# Altium footprint library Miscellaneous Base.PcbLib: 153 footprints (part 5 of 10)
Each footprint in its own frame and in the unit in brackets; x right, y up, seen from the top. Pads: shape width x height; smd on the part's side, far side on the other; paste and mask are expansions set on the pad; w line width, h text height; cw(c..) or ccw(c..) is an arc to the next point about the centre after c.
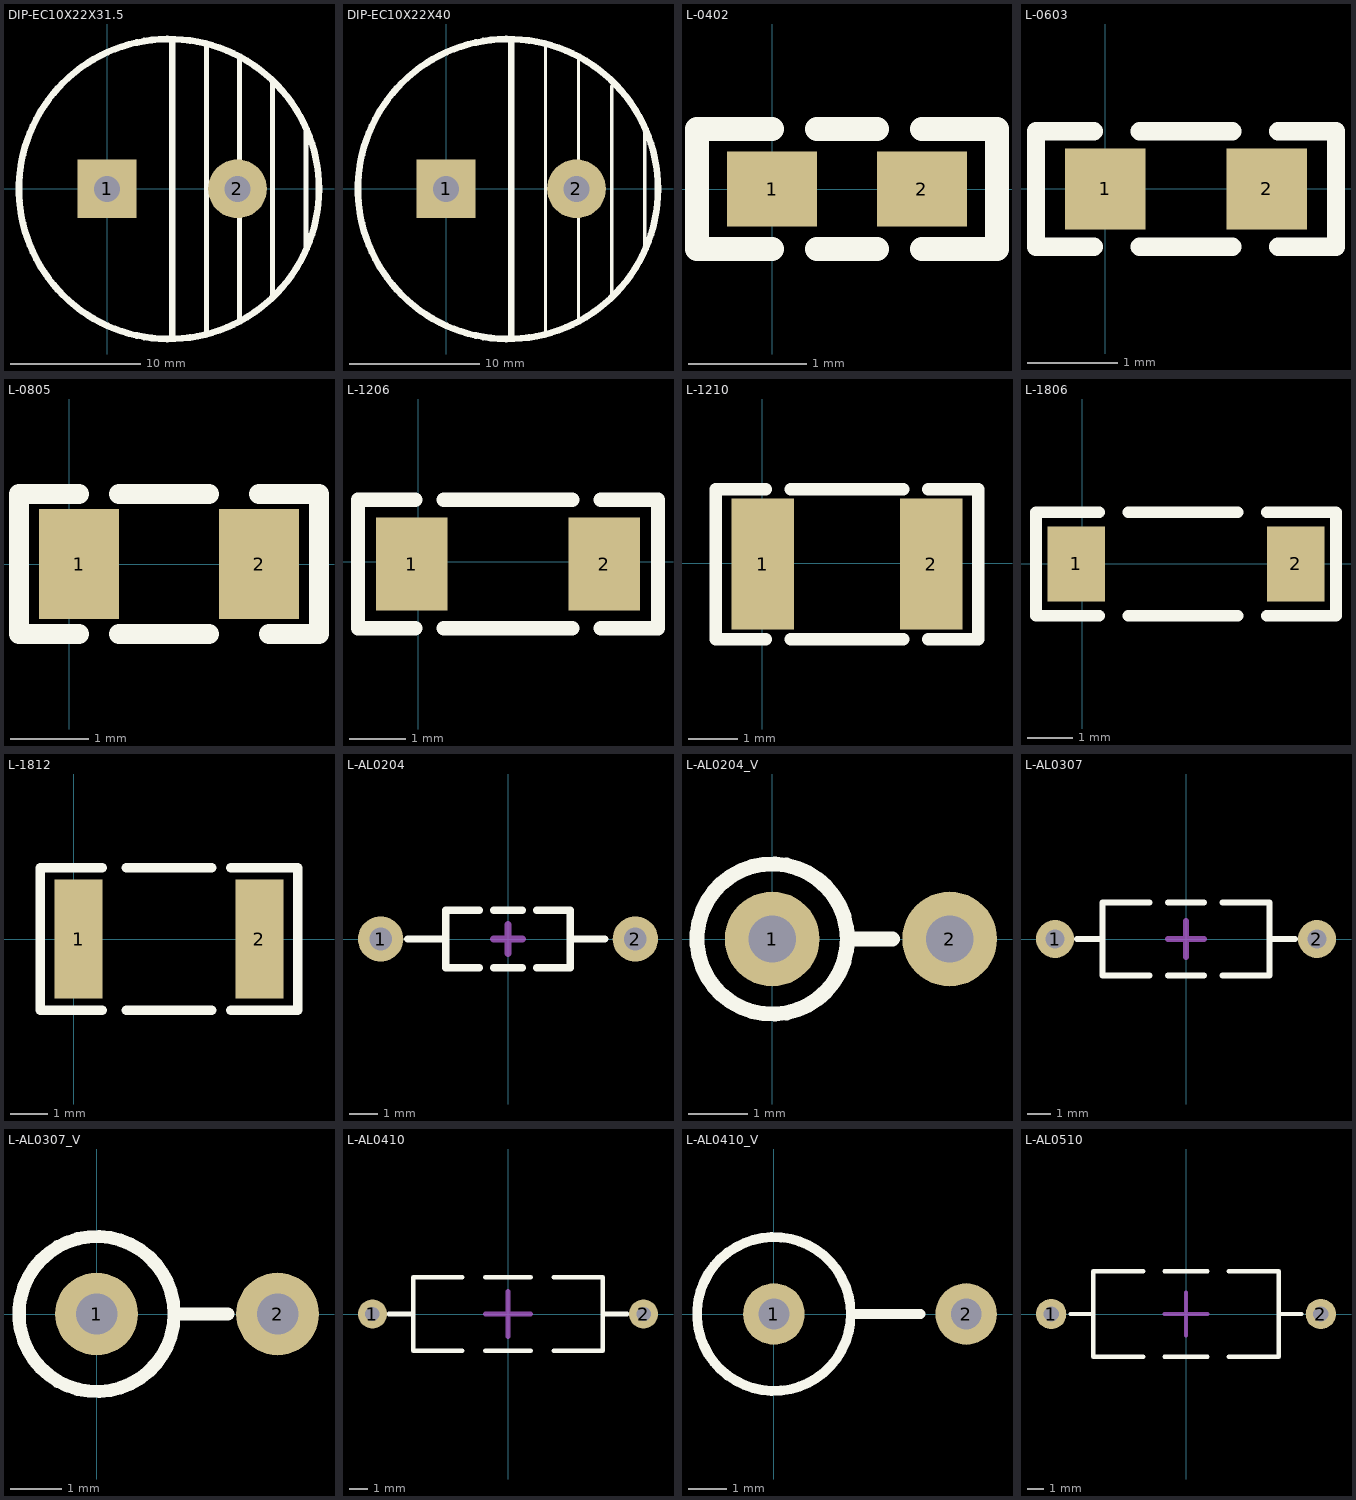
[diagram p4: the footprints below, top view; thin cyan lines are the x and y axes]

## DIP-EC10X22X31.5 [mm]
pads (2):
  rect 4.5x4.5 hole 2: 1(0,0)
  round 4.5 hole 2: 2(10,0)
Top Overlay:
  circle w0.508: c4.752,-0.013 r11.5
  lines w0.381: 7.62,-10.922 7.62,10.922 ; 10.16,-10.16 10.16,10.16 ; 12.7,-8.128 12.7,8.128 ; 15.24,-4.572 15.24,4.572
  lines w0.508: 5,-11.25 5,11.25
3D body "CAP 10X22X31.5.STEP": height 31.53, standoff -3.38, extent -5.969,-10.996 16.041,10.996

## DIP-EC10X22X40 [mm]
pads (2):
  rect 4.5x4.5 hole 2: 1(0,0)
  round 4.5 hole 2: 2(10,0)
Top Overlay:
  circle w0.508: c4.752,-0.013 r11.5
  lines w0.254: 7.62,-11.176 7.62,10.922 ; 10.16,-9.906 10.16,10.16 ; 12.7,-8.382 12.7,7.874 ; 15.24,-4.572 15.24,4.318
  lines w0.508: 5,-11.25 5,11.25
3D body "CAP 10X22X40.STEP": height 40.03, standoff -3.38, extent -6.005,-10.949 16.005,11.049

## L-0402 [mil] "小功率贴片电感"
pads (2):
  rect 30x25 smd: 1(0,0) 2(50,0)
Top Overlay:
  lines w8: 0,-20 -25,-20 -25,20 -15,20 0,20 ; 15,-20 35,-20 ; 15,20 35,20 ; 50,-20 75,-20 75,20 50,20
3D body "0402L.STEP": height 19.68, standoff 0, extent 5.31,-9.68 44.69,10

## L-0603 [mil] "小功率贴片电感"
pads (2):
  rect 35x35 smd: 1(0,0) 2(70,0)
Top Overlay:
  lines w8: -5,-25 -30,-25 -30,25 -5,25 ; 15,-25 55,-25 ; 15,25 55,25 ; 75,-25 100,-25 100,25 75,25
3D body "0603L.STEP": height 31.5, standoff 0, extent 3.5,-16.5 66.5,15

## L-0805 [mil] "小功率贴片电感"
pads (2):
  rect 40x55 smd: 1(5,0) 2(95,0)
Top Overlay:
  lines w10: 5,-35 -25,-35 -25,35 5,35 ; 25,-35 70,-35 ; 25,35 70,35 ; 95,35 125,35 125,-35 100,-35
3D body "0805L.STEP": height 35.43, standoff 0, extent 15,-23.62 93.74,23.62

## L-1206 [mil] "小功率贴片电感"
pads (2):
  rect 50x65 smd: 1(-4.51,-1.5) 2(130.49,-1.5)
Top Overlay:
  lines w10: -2.01,-46.5 -42.01,-46.5 -42.01,43.5 -2.01,43.5 ; 17.99,-46.5 107.99,-46.5 ; 17.99,43.5 107.99,43.5 ; 127.99,-46.5 167.99,-46.5 167.99,43.5 127.99,43.5
3D body "1206L.STEP": height 35.43, standoff 0, extent 0,-31.5 125.98,31.5

## L-1210 [mm] "小功率贴片电感"
pads (2):
  rect 1.27x2.667 smd: 1(0.012,-0.02) 2(3.441,-0.02)
Top Overlay:
  lines w0.254: 0.076,-1.544 -0.94,-1.544 -0.94,1.504 0.076,1.504 ; 0.584,-1.544 2.87,-1.544 ; 0.584,1.504 2.87,1.504 ; 3.378,-1.544 4.394,-1.544 4.394,1.504 3.378,1.504
3D body "1210L.STEP": height 1.3, standoff 0, extent 0,-1.25 3.2,1.25

## L-1806 [mil] "小功率贴片电感"
pads (2):
  rect 50x65 smd: 1(-5,0) 2(185,0)
Top Overlay:
  lines w10: 15,-45 -40,-45 -40,45 15,45 ; 40,-45 135,-45 ; 40,45 135,45 ; 160,-45 220,-45 220,-40 220,-15 220,45 160,45
3D body "1806.STEP": height 62.99, standoff -0.19, extent 1.42,-31.5 178.58,31.5

## L-1812 [mil] "小功率贴片电感"
pads (2):
  rect 50x125 smd: 1(5,0) 2(195,0)
Top Overlay:
  lines w10: 30,-75 -35,-75 -35,75 30,75 ; 55,-75 145,-75 ; 55,75 145,75 ; 165,-75 235,-75 235,75 165,75
3D body "1812L.STEP": height 59.06, standoff 0, extent 15,-62.99 192.16,62.99

## L-AL0204 [mm] "9*2*4mm（脚距，直径，长度）"
pads (2):
  round 1.6 hole 0.8: 1(-4.5,0) 2(4.5,0)
Top Overlay:
  lines w0.254: -3.556,0 -2.2,0 ; -1.016,-1.016 -2.2,-1.016 -2.2,1.016 -1.016,1.016 ; -0.508,-1.016 0.508,-1.016 ; -0.508,1.016 0.508,1.016 ; 1.016,-1.016 2.2,-1.016 2.2,1.016 1.016,1.016 ; 2.2,0 3.429,0
Mechanical 15:
  lines w0.254: -0.508,0 0.508,0 ; 0,-0.508 0,0.508
3D body "AL0204.STEP": height 2.07, standoff -3.5, extent -4.75,-1.016 4.75,1.017

## L-AL0204_V [mm] "3*2*4mm（脚距，直径，长度）"
pads (2):
  round 1.6 hole 0.8: 1(0,0) 2(3,0)
Top Overlay:
  circle w0.254: c0,0 r1.27
  lines w0.254: 1.27,0 2.032,0
3D body "AL0204_V.STEP": height 5.48, standoff -3.5, extent -1.084,-1.009 3.175,1.009

## L-AL0307 [mm] "11*3*7mm（脚距，直径，长度）"
pads (2):
  round 1.6 hole 0.8: 1(-5.5,0) 2(5.5,0)
Top Overlay:
  lines w0.254: -4.572,0 -3.5,0 ; -1.524,-1.524 -3.5,-1.524 -3.5,1.524 -1.524,1.524 ; -0.762,-1.524 0.762,-1.524 ; -0.762,1.524 0.762,1.524 ; 1.524,-1.524 3.5,-1.524 3.5,1.524 1.524,1.524 ; 3.5,0 4.572,0
Mechanical 15:
  lines w0.254: -0.762,0 0.762,0 ; 0,-0.762 0,0.762
3D body "AL0307.STEP": height 3.06, standoff -3.5, extent -5.715,-1.508 5.835,1.508

## L-AL0307_V [mm] "3.5*3*7mm（脚距，直径，长度）"
pads (2):
  round 1.6 hole 0.8: 1(0,0) 2(3.5,0)
Top Overlay:
  circle w0.254: c0,0 r1.5
  lines w0.254: 1.5,0 2.54,0
3D body "AL0307_V.STEP": height 8.81, standoff -3.5, extent -1.487,-1.524 3.81,1.514

## L-AL0410 [mm] "15*4*10.5mm（脚距，直径，长度）"
pads (2):
  round 1.6 hole 0.8: 1(-7.5,0) 2(7.5,0)
Top Overlay:
  lines w0.254: -6.604,0 -5.25,0 ; -2.54,-2.032 -5.25,-2.032 -5.25,2.032 -2.54,2.032 ; -1.27,-2.032 1.27,-2.032 ; -1.27,2.032 1.27,2.032 ; 2.54,-2.032 5.25,-2.032 5.25,2.032 2.54,2.032 ; 5.25,0 6.604,0
Mechanical 15:
  lines w0.254: -1.27,0 1.27,0 ; 0,-1.27 0,1.27
3D body "AL0410.STEP": height 4.06, standoff -3.5, extent -7.747,-2.005 7.803,2.005

## L-AL0410_V [mm] "5*4*10.5mm（脚距，直径，长度）"
pads (2):
  round 1.6 hole 0.8: 1(0,0) 2(5,0)
Top Overlay:
  circle w0.254: c0,0 r2
  lines w0.254: 2,0 3.81,0
3D body "AL0410_V.STEP": height 12.39, standoff -3.5, extent -2.001,-2.004 5.334,2.004

## L-AL0510 [mm] "16*5*10.5mm（脚距，直径，长度）"
pads (2):
  round 1.8 hole 0.9: 1(-8,0) 2(8,0)
Top Overlay:
  lines w0.254: -6.858,0 -5.5,0 ; -2.54,-2.54 -5.5,-2.54 -5.5,2.54 -2.54,2.54 ; -1.27,-2.54 1.27,-2.54 ; -1.27,2.54 1.27,2.54 ; 2.54,-2.54 5.5,-2.54 5.5,2.54 2.54,2.54 ; 5.5,0 6.858,0
Mechanical 15:
  lines w0.254: -1.27,0 1.27,0 ; 0,-1.27 0,1.27
3D body "AL0510.STEP": height 5.06, standoff -3.5, extent -8.318,-2.505 8.382,2.505